# Altium footprint library LimeMicroAltiumLib_pcbLib.PcbLib: 274 footprints (part 11 of 18)
Each footprint in its own frame and in the unit in brackets; x right, y up, seen from the top. Pads: shape width x height; smd on the part's side, far side on the other; paste and mask are expansions set on the pad; w line width, h text height; cw(c..) or ccw(c..) is an arc to the next point about the centre after c.
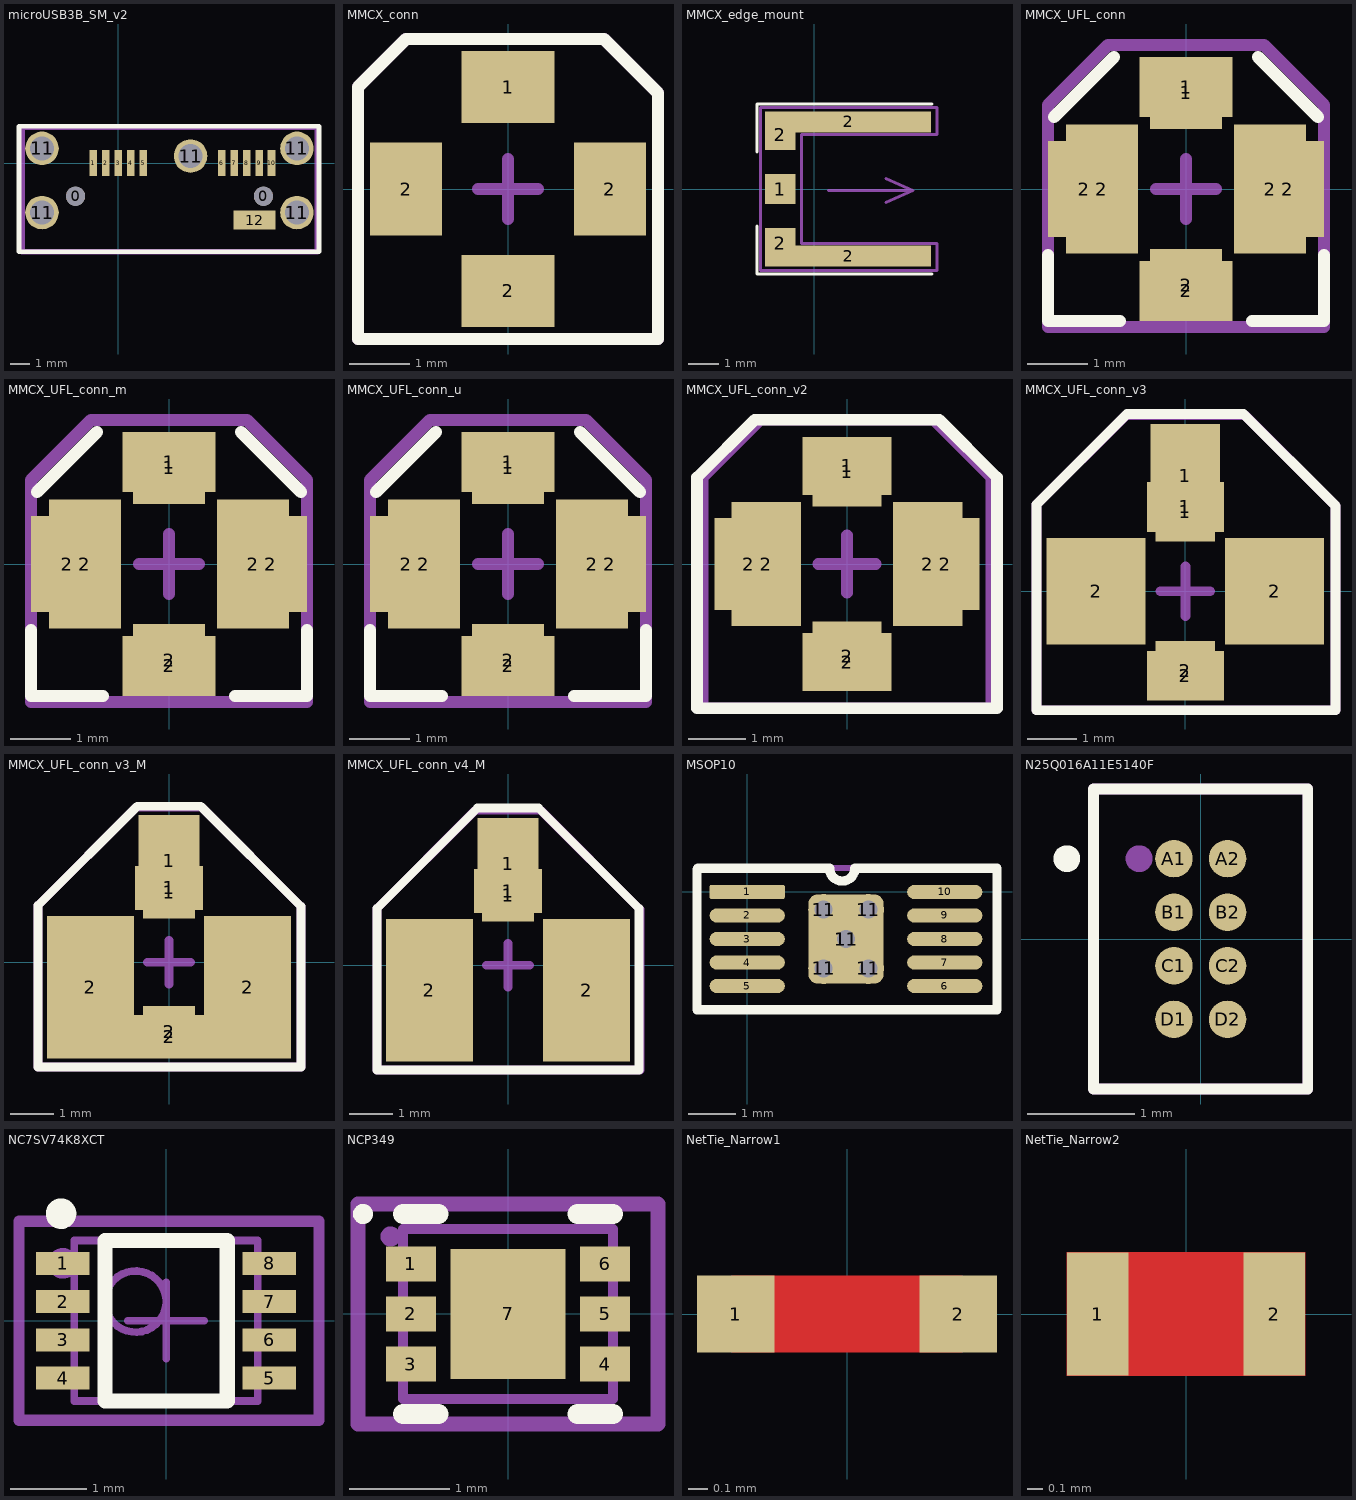
[diagram p10: the footprints below, top view; thin cyan lines are the x and y axes]

## microUSB3B_SM_v2 [mm] "GSB443T33HRCT-ND"
pads (18):
  round 1 hole 1: 0(-2.225,-1.73) 0(7.575,-1.73)
  rect 0.4x1.35 smd: 1(-1.3,0) 2(-0.65,0) 3(0,0) 4(0.65,0) 5(1.3,0) 6(5.4,0) 7(6.05,0) 8(6.7,0) 9(7.35,0) 10(8,0)
  round 1.75 hole 1.25: 11(-3.975,-2.58) 11(-3.975,0.77) 11(3.775,0.37) 11(9.325,-2.58) 11(9.325,0.77)
  rect 2.18x0.98 smd: 12(7.115,-2.97)
Top Overlay:
  lines w0.254: -5.175,-4.625 -5.175,1.925 10.475,1.925 10.475,-4.625 -5.175,-4.625
Mechanical 15:
  lines w0.3: -5.025,-4.625 -5.025,1.875 10.4,1.875 10.4,-4.625 -5.025,-4.625
  text ".Designator" at 2.675,-1.238 h0.7
3D body "USB3110-30-A_revF.step": height 5.27, standoff 1.53, extent -4.032,-6.525 9.382,-0.607
3D body: height 2.7, standoff 0, extent -4.032,-4.625 9.382,-0.607

## MMCX_conn [mm]
pads (4):
  rect 1.55x1.2 smd: 1(0,1.7) 2(0,-1.7)
  rect 1.2x1.55 smd: 2(-1.7,0) 2(1.7,0)
Top Overlay:
  lines w0.2: -2.5,-2.5 -2.5,1.7 -1.7,2.5 1.6,2.5 2.5,1.6 2.5,-2.5 -2.5,-2.5
Mechanical 15:
  lines w0.2: -0.5,0 0.5,0 ; 0,-0.5 0,0.5 ; -2.5,-2.5 2.5,-2.5 2.5,1.6 1.6,2.5 -1.7,2.5 -2.5,1.7 -2.5,-2.5
  text "in" at -0.7,1.3 h0.9
  text ".designator" at 0,0 h0.9
3D body "User Library-Molex_MMCX_734152061.step": height 5, standoff 0, extent -2.475,-2.475 2.475,2.475

## MMCX_edge_mount [mm]
pads (5):
  rect 1x1 smd mask+0.05: 1(-1.125,0) 2(-1.125,-1.8) 2(-1.125,1.8)
  rect 5.5x0.7 smd mask+0.05: 2(1.125,-2.225) 2(1.125,2.225)
Top Overlay:
  lines w0.1: -1.9,-1.225 -1.9,-2.825 3.9,-2.825 ; -1.9,1.225 -1.9,2.825 3.9,2.825
Mechanical 15:
  lines w0.1: 0.475,-0.05 3.275,-0.05 ; 2.375,-0.45 3.275,-0.05 ; 2.375,0.35 3.275,-0.05 ; -1.775,-2.7 4.075,-2.7 4.075,-1.8 -0.425,-1.8 -0.425,1.8 4.075,1.8 4.075,2.7 -1.775,2.7 -1.775,-2.7
  text "PCB cutout" at 0.175,1.15 h0.4
  text ".Designator" at -1.15,-0.05 h0.55
3D body "MMCX_CONN_90.STEP": height 2.1, standoff -1.41, extent -1.6,-2.235 3.85,2.235

## MMCX_UFL_conn [mm]
pads (8):
  rect 1.2x1.2 smd mask+0.05: 1(0,1.6) 2(0,-1.6)
  rect 1.55x1 smd mask+0.05: 1(0,1.7) 2(0,-1.7)
  rect 1.2x1.6 smd mask+0.05: 2(-1.7,0) 2(1.7,0)
  rect 1.2x2.15 smd mask+0.05: 2(-1.4,0) 2(1.4,0)
Top Overlay:
  lines w0.2: -2.3,-1.1 -2.3,-2.2 -1.1,-2.2 ; -2.2,1.2 -1.2,2.2 ; 1.1,-2.2 2.3,-2.2 2.3,-1.1 ; 1.2,2.2 2.2,1.2
Mechanical 15:
  lines w0.2: -0.5,0 0.5,0 ; 0,-0.5 0,0.5 ; -2.3,-2.3 2.3,-2.3 2.3,1.4 1.3,2.4 -1.3,2.4 -2.3,1.4 -2.3,-2.3
  text "in" at -0.7,1.3 h0.9
  text ".designator" at 0,0 h0.9
3D body "User Library-U_FL-R-SMT-1.step": height 1.25, standoff -0.01, extent -1.5,-1.55 1.5,1.55
3D body "User Library-Molex_MMCX_734152061.step": height 5, standoff 0, extent -2.475,-2.475 2.475,2.475

## MMCX_UFL_conn_m [mm]
pads (8):
  rect 1.2x1.2 smd mask+0.05: 1(0,1.6) 2(0,-1.6)
  rect 1.55x1 smd mask+0.05: 1(0,1.7) 2(0,-1.7)
  rect 1.2x1.6 smd mask+0.05: 2(-1.7,0) 2(1.7,0)
  rect 1.2x2.15 smd mask+0.05: 2(-1.4,0) 2(1.4,0)
Top Overlay:
  lines w0.2: -2.3,-1.1 -2.3,-2.2 -1.1,-2.2 ; -2.2,1.2 -1.2,2.2 ; 1.1,-2.2 2.3,-2.2 2.3,-1.1 ; 1.2,2.2 2.2,1.2
Mechanical 15:
  lines w0.2: -0.5,0 0.5,0 ; 0,-0.5 0,0.5 ; -2.3,-2.3 -2.3,1.4 -1.3,2.4 1.3,2.4 2.3,1.4 2.3,-2.3 -2.3,-2.3
  text ".designator" at 0,0 h0.9
  text "in" at -0.7,1.3 h0.9
3D body "User Library-Molex_MMCX_734152061.step": height 5, standoff 0, extent -2.475,-2.475 2.475,2.475

## MMCX_UFL_conn_u [mm]
pads (8):
  rect 1.2x1.2 smd mask+0.05: 1(0,1.6) 2(0,-1.6)
  rect 1.55x1 smd mask+0.05: 1(0,1.7) 2(0,-1.7)
  rect 1.2x1.6 smd mask+0.05: 2(-1.7,0) 2(1.7,0)
  rect 1.2x2.15 smd mask+0.05: 2(-1.4,0) 2(1.4,0)
Top Overlay:
  lines w0.2: -2.3,-1.1 -2.3,-2.2 -1.1,-2.2 ; -2.2,1.2 -1.2,2.2 ; 1.1,-2.2 2.3,-2.2 2.3,-1.1 ; 1.2,2.2 2.2,1.2
Mechanical 15:
  lines w0.2: -0.5,0 0.5,0 ; 0,-0.5 0,0.5 ; -2.3,-2.3 -2.3,1.4 -1.3,2.4 1.3,2.4 2.3,1.4 2.3,-2.3 -2.3,-2.3
  text ".designator" at 0,0 h0.9
  text "in" at -0.7,1.3 h0.9
3D body "User Library-U_FL-R-SMT-1.step": height 1.25, standoff -0.01, extent -1.5,-1.55 1.5,1.55

## MMCX_UFL_conn_v2 [mm]
pads (8):
  rect 1.2x1.2 smd mask+0.05: 1(0,1.6) 2(0,-1.6)
  rect 1.55x1 smd mask+0.05: 1(0,1.7) 2(0,-1.7)
  rect 1.2x1.6 smd mask+0.05: 2(-1.7,0) 2(1.7,0)
  rect 1.2x2.15 smd mask+0.05: 2(-1.4,0) 2(1.4,0)
Top Overlay:
  lines w0.2: -2.6,-2.5 2.6,-2.5 2.6,1.5 1.6,2.5 -1.6,2.5 -2.6,1.5 -2.6,-2.5
Mechanical 15:
  lines w0.2: -0.5,0 0.5,0 ; 0,-0.5 0,0.5 ; -2.5,-2.5 -2.5,1.5 -1.5,2.5 1.5,2.5 2.5,1.5 2.5,-2.5 -2.5,-2.5
  text ".designator" at 0,0 h0.9
  text "in" at -0.7,1.3 h0.9
3D body "User Library-U_FL-R-SMT-1.step": height 1.25, standoff -0.01, extent -1.5,-1.55 1.5,1.55
3D body "User Library-Molex_MMCX_734152061.step": height 5, standoff 0, extent -2.475,-2.475 2.475,2.475

## MMCX_UFL_conn_v3 [mm]
pads (7):
  rect 1.2x1.2 smd mask+0.05: 1(0,1.6) 2(0,-1.6)
  rect 1.55x1 smd mask+0.05: 1(0,1.7) 2(0,-1.7)
  rect 1.4x2.1 smd mask+0.05: 1(0,2.325)
  rect 2x2.15 smd mask+0.05: 2(-1.8,0) 2(1.8,0)
Top Overlay:
  lines w0.2: -3,-2.4 3.025,-2.4 3.025,1.725 1.175,3.575 -1.175,3.575 -3,1.75 -3,-2.4
Mechanical 15:
  lines w0.2: -0.5,0 0.5,0 ; 0,-0.5 0,0.5 ; -3,-2.4 -3,1.75 -1.2,3.55 1.2,3.55 3.025,1.725 3.025,-2.4 -3,-2.4
  text ".designator" at 0,0 h0.9
  text "in" at -0.7,1.3 h0.9
3D body "12078.stp": height 5, standoff 0, extent -2.5,-1.55 2.5,3.45
3D body "User Library-U_FL-R-SMT-1.step": height 1.25, standoff -0.01, extent -1.5,-1.55 1.5,1.55
3D body "User Library-Molex_MMCX_734152061.step": height 5, standoff 0, extent -2.475,-2.475 2.475,2.475

## MMCX_UFL_conn_v3_M [mm]
pads (7):
  rect 1.2x1.2 smd mask+0.05: 1(0,1.6) 2(0,-1.6)
  rect 1.55x1 smd mask+0.05: 1(0,1.7)
  rect 1.4x2.1 smd mask+0.05: 1(0,2.325)
  rect 2x3.275 smd mask+0.05: 2(-1.8,-0.575) 2(1.8,-0.575)
  rect 1.6x1 smd mask+0.05: 2(0,-1.713)
Top Overlay:
  lines w0.2: -3,-2.4 -3,1.3 -0.725,3.575 0.725,3.575 3.025,1.275 3.025,-2.4 -3,-2.4
Mechanical 15:
  lines w0.2: -0.5,0 0.5,0 ; 0,-0.5 0,0.5 ; -3,-2.4 3.025,-2.4 3.025,1.275 0.75,3.55 -0.75,3.55 -3,1.3 -3,-2.4
  text "in" at -0.7,1.3 h0.9
  text ".designator" at 0,0 h0.9
3D body "12078.stp": height 5, standoff 0, extent -2.5,-2.425 2.5,2.575

## MMCX_UFL_conn_v4_M [mm]
pads (5):
  rect 1.2x1.2 smd mask+0.05: 1(0,1.6)
  rect 1.55x1 smd mask+0.05: 1(0,1.7)
  rect 1.4x2.1 smd mask+0.05: 1(0,2.325)
  rect 2x3.275 smd mask+0.05: 2(-1.8,-0.575) 2(1.8,-0.575)
Top Overlay:
  lines w0.2: -3,-2.4 -3,1.3 -0.7,3.6 0.7,3.6 3,1.3 3,-2.4 0,-2.4 -3,-2.4
Mechanical 15:
  lines w0.2: -0.5,0 0.5,0 ; 0,-0.5 0,0.5 ; -3,-2.4 -3,1.3 -0.75,3.55 0.75,3.55 3.025,1.275 3.025,-2.4 -3,-2.4
  text ".designator" at 0,0 h0.9
  text "in" at -0.7,1.3 h0.9
3D body "12078.stp": height 5, standoff 0, extent -2.5,-2.425 2.5,2.575

## MSOP10 [mm]
pads (16):
  rrect25% 1.6x0.3 smd mask+0.05: 1(0,0)
  oval 1.6x0.3 smd mask+0.05: 2(0,-0.5) 3(0,-1) 4(0,-1.5) 5(0,-2) 6(4.2,-2) 7(4.2,-1.5) 8(4.2,-1) 9(4.2,-0.5) 10(4.2,0)
  round 0.66 hole 0.381: 11(1.625,-1.625) 11(1.625,-0.375) 11(2.1,-1) 11(2.575,-1.625) 11(2.575,-0.375)
  rrect25% 1.6x1.9 smd: 11(2.1,-1)
Top Overlay:
  lines w0.2: 1.725,0.5 -1.049,0.5 -1.067,0.483 -1.067,-2.5 5.309,-2.5 5.309,0.5 2.3,0.5 ; 1.75,0.5 ccw(c2.019,0.5) 2.289,0.5
Top Solder:
  rectangle: 1.175,-2.075 3.025,0.075
Mechanical 15:
  lines w0.127: -1.067,-2.489 5.309,-2.489 5.309,0.508 -1.067,0.508 -1.067,-2.489
  text ".Designator" at 2.1,-1 h0.7
3D body "User Library-MSOP10-1.step": height 1.09, standoff 0, extent -0.475,-2.6 4.675,0.6

## N25Q016A11E5140F [mm] "2.8 x 2 16 MB memory"
height 0.41
pads (8):
  round 0.35 smd mask+0.03: A1(-0.25,0.75) A2(0.25,0.75) B1(-0.25,0.25) B2(0.25,0.25) C1(-0.25,-0.25) C2(0.25,-0.25) D1(-0.25,-0.75) D2(0.25,-0.75)
Top Overlay:
  circle w0.2: c-1.25,0.75 r0.025
  lines w0.1: -1,-1.4 1,-1.4 1,1.4 -1,1.4 -1,-1.4
Mechanical 15:
  circle w0.2: c-0.575,0.75 r0.025
  lines w0.1: -1,-1.4 1,-1.4 1,1.4 -1,1.4 -1,-1.4
  text ".Designator" at 0,0 h0.55
3D body: height 0.41, standoff 0, extent -1,-1.4 1,1.4
3D body: height 0.42, standoff 0.41, extent -0.675,0.675 -0.275,1.075

## NC7SV74K8XCT [mm] "SOIC, 8-Leads, Body 2,00x2,30mm, Pitch 1,27mm, IPC Medium Density"
height 0.9
pads (8):
  rect 0.7x0.3 smd mask+0.05: 1(-1.35,0.75) 2(-1.35,0.25) 3(-1.35,-0.25) 4(-1.35,-0.75) 5(1.35,-0.75) 6(1.35,-0.25) 7(1.35,0.25) 8(1.35,0.75)
Top Overlay:
  circle w0.25: c-1.375,1.4 r0.075
  lines w0.2: -0.8,-1.05 0.8,-1.05 0.8,1.05 -0.8,1.05 -0.8,-1.05
Mechanical 13:
  circle w0.1: c-0.4,0.25 r0.4
  lines w0.1: -1.2,-1.05 1.2,-1.05 1.2,1.05 -1.2,1.05 -1.2,-1.05
Mechanical 15:
  circle w0.25: c-1.35,0.75 r0.075
  lines w0.1: -0.5,0 0.5,0 ; 0,-0.5 0,0.5
  lines w0.15: -1.925,-1.3 2,-1.3 2,1.3 -1.925,1.3 -1.925,-1.3
  text ".Designator" at 0,0.025 h0.7
3D body: height 0.9, standoff 0.1, extent -1.2,-1.05 1.2,1.05

## NCP349 [mm] "SON, 6-Leads, Body 1,60x2,00mm, Pitch 0,50mm, Thermal Pad 1,20x0,79mm, IPC Medium Density"
height 1
pads (7):
  rect 0.5x0.35 smd mask+0.05: 1(-0.97,0.5) 2(-0.97,0) 3(-0.97,-0.5) 4(0.97,-0.5) 5(0.97,0) 6(0.97,0.5)
  rect 1.15x1.3 smd mask+0.05: 7(0,0)
Top Overlay:
  circle w0.1: c-1.45,1 r0.05
  lines w0.2: -1.05,-1 -0.695,-1 ; -1.05,1 -0.695,1 ; 0.695,-1 1.05,-1 ; 0.695,1 1.05,1
Mechanical 13:
  lines w0.1: -1.05,-0.85 -1.05,0.85 1.05,0.85 1.05,-0.85 -1.05,-0.85
Mechanical 15:
  circle w0.1: c-1.175,0.775 r0.05
  lines w0.1: -0.5,0 0.5,0 ; 0,-0.5 0,0.5
  lines w0.15: -1.5,-1.1 -1.5,1.1 1.5,1.1 1.5,-1.1 -1.5,-1.1
  text ".Designator" at 0,0 h0.7
3D body: height 1, standoff 0.1, extent -1.05,-0.85 1.05,0.85

## NetTie_Narrow1 [mm]
pads (2):
  rect 0.4x0.4 smd: 1(-0.575,0) 2(0.575,0)
Top Layer:
  lines w0.4: -0.575,0 0.575,0

## NetTie_Narrow2 [mm]
pads (2):
  rect 0.4x0.8 smd: 1(-0.575,0) 2(0.575,0)
Top Layer:
  region: -0.775,0.4 -0.775,-0.4 0.775,-0.4 0.775,0.4